# Altium footprint library chipfc_libs.PCBLIB: 337 footprints (part 22 of 22)
Each footprint in its own frame and in the unit in brackets; x right, y up, seen from the top. Pads: shape width x height; smd on the part's side, far side on the other; paste and mask are expansions set on the pad; w line width, h text height; cw(c..) or ccw(c..) is an arc to the next point about the centre after c.
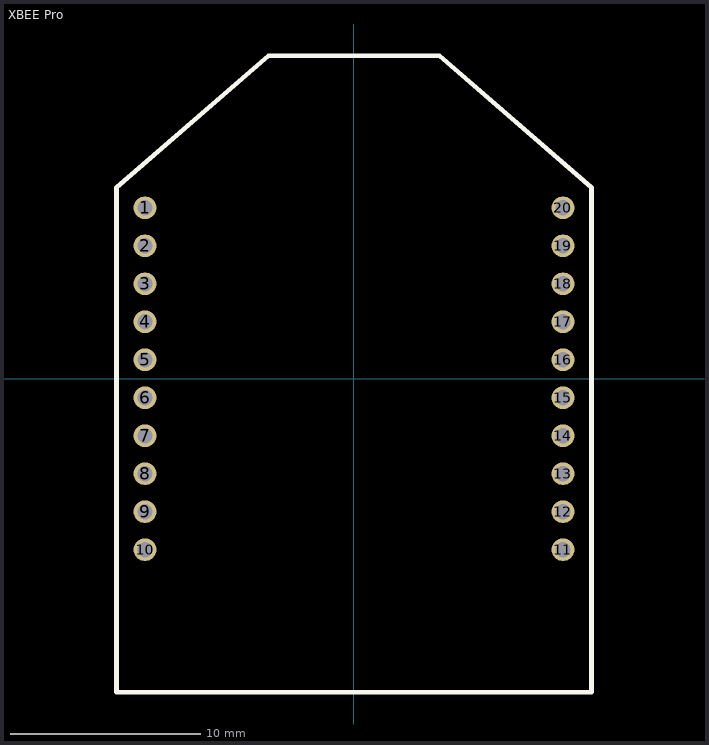
[diagram p21: the footprint, top view; thin cyan lines are the x and y axes]

## XBEE Pro [mm]
pads (20):
  round 1.2 hole 0.8: 1(-11,9) 2(-11,7) 3(-11,5) 4(-11,3) 5(-11,1) 6(-11,-1) 7(-11,-3) 8(-11,-5) 9(-11,-7) 10(-11,-9) 11(11,-9) 12(11,-7) 13(11,-5) 14(11,-3) 15(11,-1) 16(11,1) 17(11,3) 18(11,5) 19(11,7) 20(11,9)
Top Overlay:
  lines w0.254: -12.5,-16.5 -12.5,10.067 -4.5,17 4.5,17 12.5,10.067 12.5,-16.5 -12.5,-16.5
3D body "User Library-XBP24BZ7SIT-004-radio.step": height 6.5, standoff -3.38, extent -12.192,-16.51 12.192,30.861